# Altium footprint library X98_CARRIER_V1R2_12082022.PcbLib: 104 footprints (part 6 of 7)
Each footprint in its own frame and in the unit in brackets; x right, y up, seen from the top. Pads: shape width x height; smd on the part's side, far side on the other; paste and mask are expansions set on the pad; w line width, h text height; cw(c..) or ccw(c..) is an arc to the next point about the centre after c.
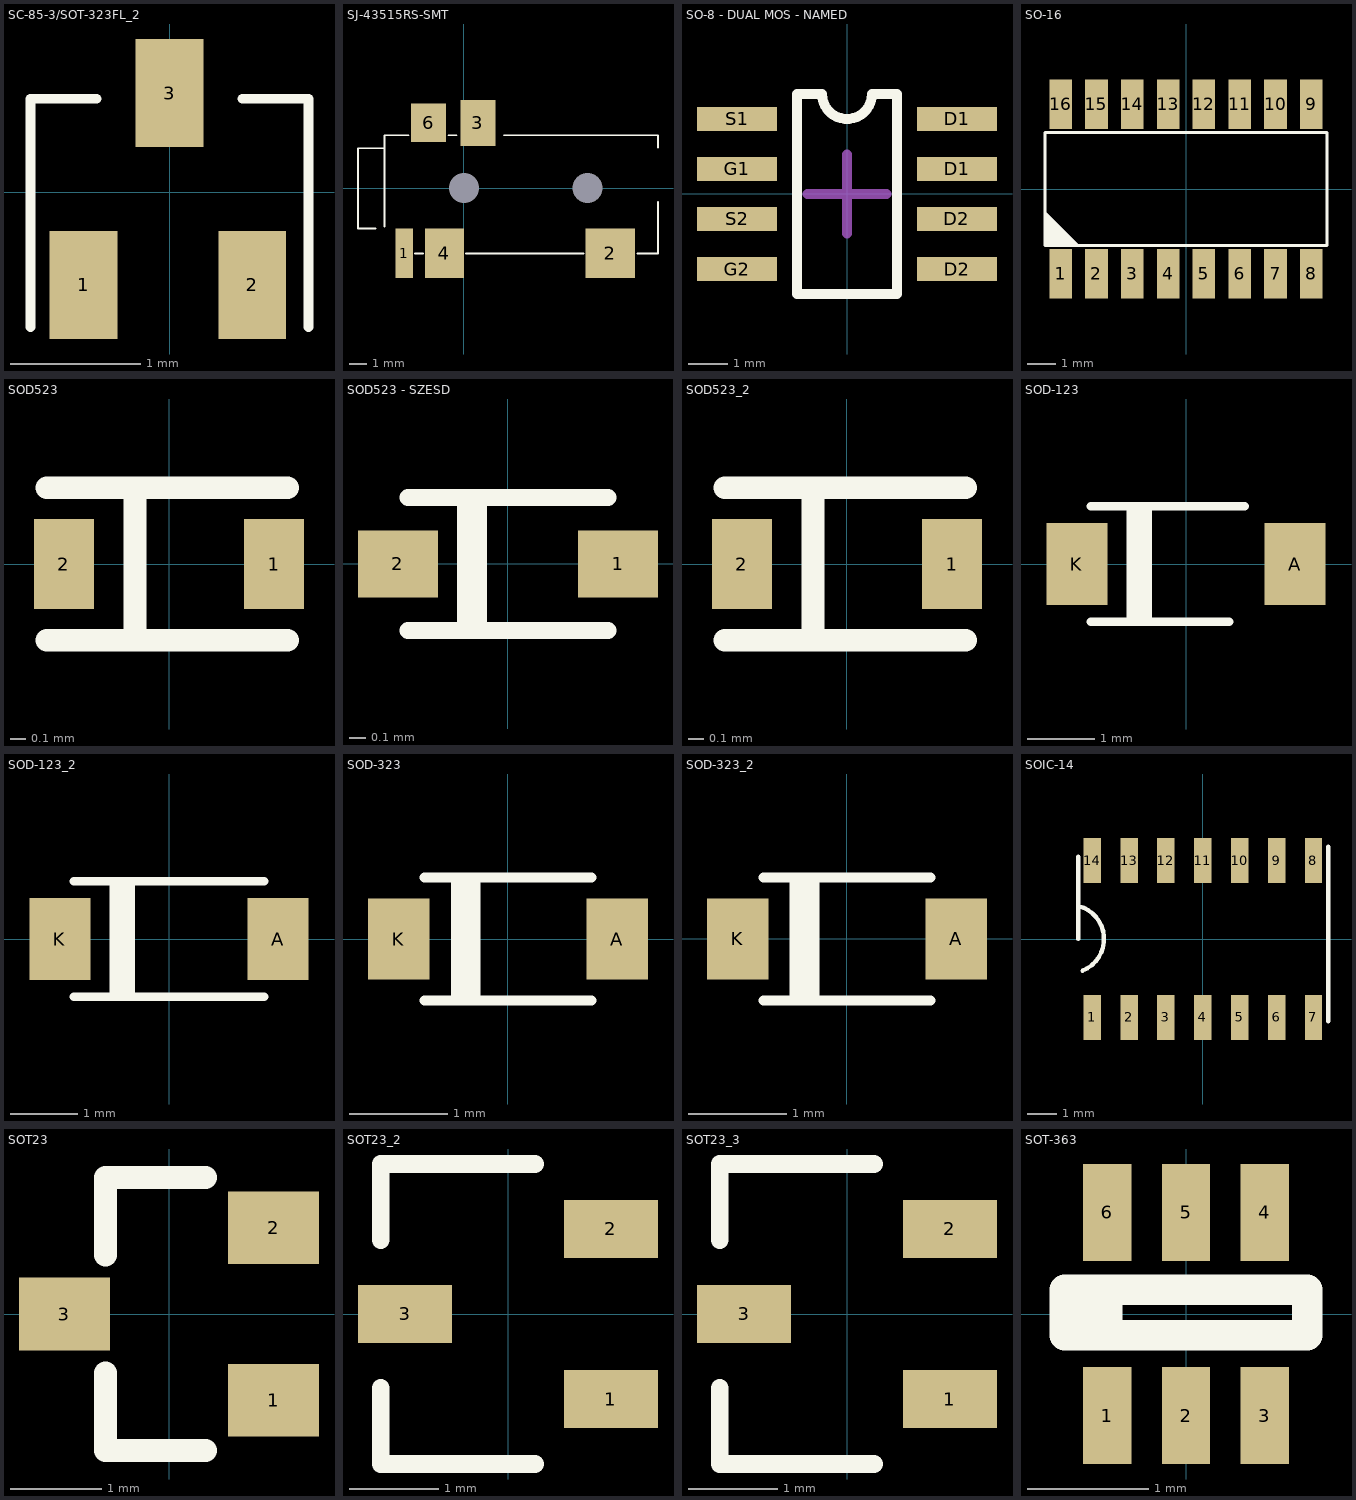
[diagram p5: the footprints below, top view; thin cyan lines are the x and y axes]

## SC-85-3/SOT-323FL_2 [mm]
pads (3):
  rect 0.52x0.83 smd mask+0.051: 1(-0.66,-0.711) 2(0.635,-0.711) 3(0,0.762)
Top Overlay:
  lines w0.076: -1.067,-1.035 -1.067,0.718 -0.559,0.718 ; 0.559,0.718 1.067,0.718 1.067,-1.035
3D body "User Library-SOT323 (SC70-3)-1.STEP": height 1.1, standoff 0, extent -1.108,-1.097 1.092,1.148

## SJ-43515RS-SMT [mm] "CONN JACK 3.5MM"
pads (7):
  round 0 hole 1.7: 0(0,0) 0(7,0)
  rect 1x2.8 smd mask+0.051: 1(-3.375,-3.7)
  rect 2.8x2.8 smd mask+0.051: 2(8.3,-3.7)
  rect 2x2.6 smd mask+0.051: 3(0.8,3.7)
  rect 2.2x2.8 smd mask+0.051: 4(-1.1,-3.7)
  rect 2x2.2 smd mask+0.051: 6(-2,3.7)
Top Overlay:
  lines w0.102: -5.009,-2.286 -6,-2.286 -6,2.261 -4.501,2.261 ; -4.501,-2.184 -4.501,2.997 ; -4.501,3 -3.129,3 ; -2.774,-3.7 -2.317,-3.7 ; -0.869,3 -0.412,3 ; 0.122,-3.7 6.777,-3.7 ; 2.27,3 11,3 ; 9.825,-3.7 10.993,-3.7 ; 11,-3.7 11,-0.787 ; 11,2.286 11,2.997
3D body "CUI_SJ-43515RS-SMT-TR.step": height 5.1, standoff -0.7, extent -6.218,-4.496 10.982,4.504

## SO-8 - DUAL MOS - NAMED [mil] "body:5.3 X 7.6 mm( W x L) pitch:1.27 mm"
pads (8):
  rect 80x24 smd: D1(110,25) D1(110,75) D2(110,-25) D2(110,-75) G1(-110,25) G2(-110,-75) S1(-110,75) S2(-110,-25)
Top Overlay:
  lines w10: -50,-100 -50,100 -25,100 ccw(c0,100) 25,100 50,100 50,-100 -50,-100
Mechanical 15:
  lines w10: -39.37,0 39.37,0 ; 0,-39.37 0,39.37
3D body "SW3DPS-SO-8 (PIC12FXXX)-DEFAULT.STEP": height 62.99, standoff 0, extent -117.91,-96.46 117.91,96.46

## SO-16 [mm]
height 1.75
pads (16):
  rect 0.8x1.75 smd mask+0.051: 1(-4.445,-3) 2(-3.175,-3) 3(-1.905,-3) 4(-0.635,-3) 5(0.635,-3) 6(1.905,-3) 7(3.175,-3) 8(4.445,-3) 9(4.445,3) 10(3.175,3) 11(1.905,3) 12(0.635,3) 13(-0.635,3) 14(-1.905,3) 15(-3.175,3) 16(-4.445,3)
Top Overlay:
  region: -3.785,-2 -4.972,-0.813 -5,-0.813 -5,-2
  lines w0.102: -5,-2 5,-2 5,2 -5,2 -5,-2
3D body "User Library-so16.STEP": height -1, standoff -2.7, extent -5.095,-2.921 5.105,3.079

## SOD523 [mm] "SOD-523F; 2 Leads; Body 1.3 x 0.9 mm, (LxW)"
height 0.7
pads (2):
  rect 0.4x0.6 smd mask+0.025: 1(0.7,0) 2(-0.7,0)
Top Overlay:
  lines w0.152: -0.815,-0.508 0.79,-0.508 ; -0.815,0.508 0.79,0.508 ; -0.227,-0.508 -0.227,0.508
3D body "SOD-523F.STEP": height 0.7, standoff 0, extent -0.85,-0.45 0.85,0.45

## SOD523 - SZESD [mm]
pads (2):
  rect 0.48x0.4 smd mask+0.051: 1(0.66,0) 2(-0.66,0)
Top Overlay:
  rectangle: -0.305,-0.4 -0.127,0.4
  lines w0.102: -0.6,-0.4 0.6,-0.4 ; -0.6,0.4 0.6,0.4
3D body "SOD-523F.STEP": height 0.7, standoff 0, extent -0.85,-0.457 0.85,0.443

## SOD523_2 [mm]
pads (2):
  rect 0.4x0.6 smd mask+0.025: 1(0.7,0) 2(-0.7,0)
Top Overlay:
  lines w0.152: -0.815,-0.508 0.79,-0.508 ; -0.815,0.508 0.79,0.508 ; -0.227,-0.508 -0.227,0.508
3D body "SOD-523F.STEP": height 0.7, standoff 0, extent -0.85,-0.45 0.85,0.45

## SOD-123 [mm]
pads (2):
  rect 0.91x1.22 smd mask+0.1: A(1.625,0) K(-1.625,0)
Top Overlay:
  rectangle: -0.889,-0.863 -0.508,0.864
  lines w0.127: -1.422,-0.864 0.644,-0.864 ; -1.422,0.864 0.872,0.864
3D body "User Library-SOD-123_DiodesInc.STEP": height 1.42, standoff -0.03, extent -1.925,-0.836 1.925,0.864

## SOD-123_2 [mm]
pads (2):
  rect 0.91x1.22 smd mask+0.1: A(1.625,0) K(-1.625,0)
Top Overlay:
  rectangle: -0.889,-0.864 -0.508,0.864
  lines w0.127: -1.422,-0.864 1.422,-0.864 ; -1.422,0.864 1.422,0.864
3D body "User Library-SOD-123_DiodesInc.STEP": height 1.42, standoff -0.03, extent -1.925,-0.836 1.925,0.864

## SOD-323 [mm]
pads (2):
  rect 0.63x0.83 smd mask+0.051: A(1.115,0) K(-1.115,0)
Top Overlay:
  rectangle: -0.584,-0.625 -0.279,0.625
  lines w0.102: -0.85,-0.625 0.85,-0.625 ; -0.85,0.625 0.85,0.625
3D body "User Library-SOD323-1.STEP": height 1.1, standoff 0, extent -1.3,-0.686 1.3,0.664

## SOD-323_2 [mm]
pads (2):
  rect 0.63x0.83 smd mask+0.051: A(1.115,0) K(-1.115,0)
Top Overlay:
  rectangle: -0.584,-0.625 -0.279,0.625
  lines w0.102: -0.85,-0.625 0.85,-0.625 ; -0.85,0.625 0.85,0.625
3D body "User Library-SOD323-1.STEP": height 1.1, standoff 0, extent -1.3,-0.686 1.3,0.664

## SOIC-14 [mm]
pads (14):
  rect 0.6x1.55 smd mask+0.051: 1(-3.81,-2.7) 2(-2.54,-2.7) 3(-1.27,-2.7) 4(0,-2.7) 5(1.27,-2.7) 6(2.54,-2.7) 7(3.81,-2.7) 8(3.81,2.7) 9(2.54,2.7) 10(1.27,2.7) 11(0,2.7) 12(-1.27,2.7) 13(-2.54,2.7) 14(-3.81,2.7)
Top Overlay:
  lines w0.152: -4.289,0 -4.289,2.825 ; -4.288,1.136 cw(c-4.572,0) -4.141,-1.089 ; 4.325,-2.825 4.325,3.175
3D body "SOIC14_SL_MCH.step": height 1.76, standoff 0, extent -4.331,-2.997 4.331,2.997

## SOT23 [mm] "SOT-23; 3 Leads; Body 3.0 x 2.5 mm, inc. leads (LxW max)"
height 1.1
pads (3):
  rect 1x0.8 smd mask+0.051: 1(1.15,-0.95) 2(1.15,0.95) 3(-1.15,0)
Top Overlay:
  lines w0.254: -0.7,-0.65 -0.7,-1.5 0.4,-1.5 ; -0.7,0.65 -0.7,1.5 0.4,1.5
3D body "SW3DPS-SOT-23-DEFAULT.STEP": height 1.05, standoff -0.05, extent -1.23,-1.5 1.27,1.5

## SOT23_2 [mm]
pads (3):
  rect 1.05x0.65 smd mask+0.051: 1(1.15,-0.95) 2(1.15,0.95) 3(-1.15,0)
Top Overlay:
  lines w0.2: -1.422,-0.825 -1.422,-1.676 0.3,-1.676 ; -1.422,0.825 -1.422,1.676 0.3,1.676
3D body "SW3DPS-SOT-23-DEFAULT.STEP": height 1.05, standoff -0.05, extent -1.23,-1.5 1.27,1.5

## SOT23_3 [mm]
pads (3):
  rect 1.05x0.65 smd mask+0.051: 1(1.15,-0.95) 2(1.15,0.95) 3(-1.15,0)
Top Overlay:
  lines w0.2: -1.422,-0.825 -1.422,-1.676 0.3,-1.676 ; -1.422,0.825 -1.422,1.676 0.3,1.676
3D body "SW3DPS-SOT-23-DEFAULT.STEP": height 1.05, standoff -0.05, extent -1.23,-1.5 1.27,1.5

## SOT-363 [mm]
pads (6):
  rect 0.4x0.8 smd mask+0.051: 1(-0.65,-0.837) 2(0,-0.837) 3(0.65,-0.837) 4(0.65,0.838) 5(0,0.838) 6(-0.65,0.838)
Top Overlay:
  rectangle: -1,-0.15 -0.525,0.2
  lines w0.254: -1,-0.175 -1,0.2 1,0.2 1,-0.175 -1,-0.175
3D body "User Library-SW3dPS-SOT363.STEP": height 1, standoff 0.01, extent -1,-1.05 1,1.05